# Altium footprint library JL_PCB.PCBLIB: 1112 footprints (part 28 of 71)
Each footprint in its own frame and in the unit in brackets; x right, y up, seen from the top. Pads: shape width x height; smd on the part's side, far side on the other; paste and mask are expansions set on the pad; w line width, h text height; cw(c..) or ccw(c..) is an arc to the next point about the centre after c.
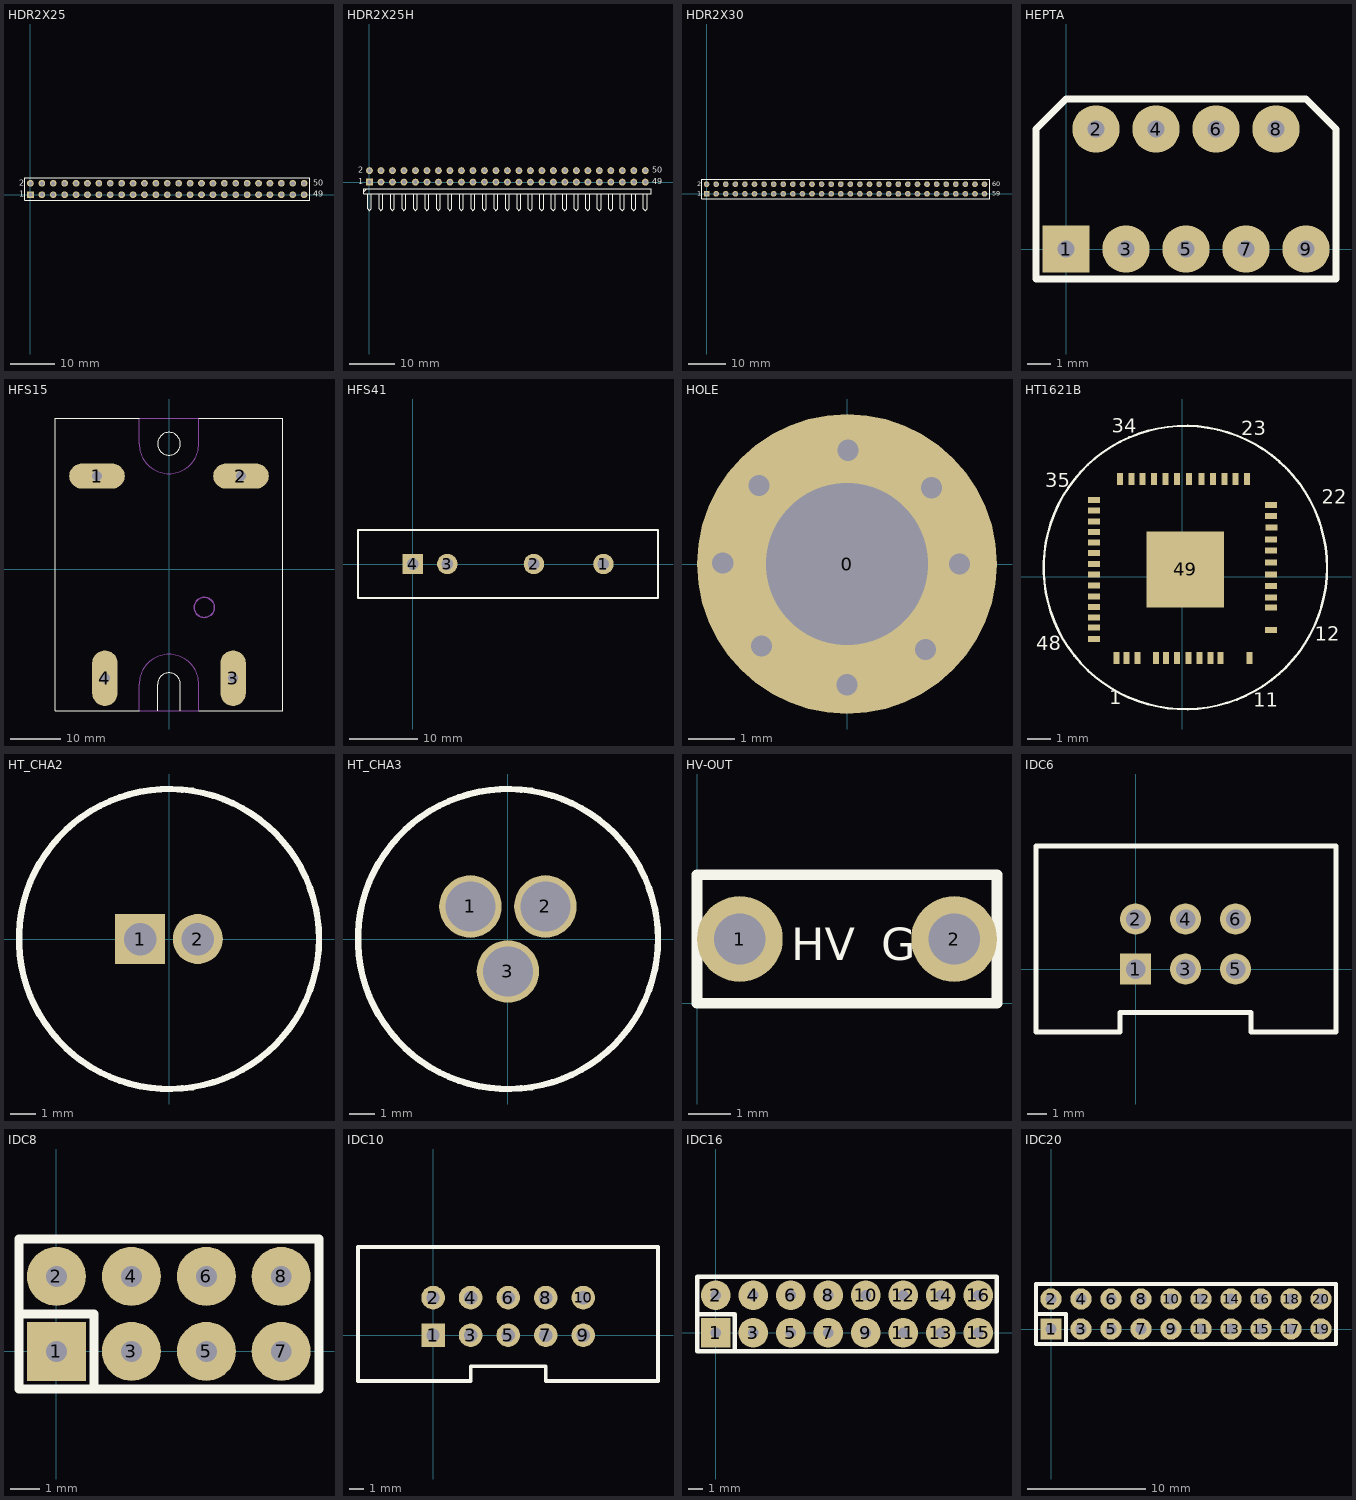
[diagram p27: the footprints below, top view; thin cyan lines are the x and y axes]

## HDR2X25 [mm] "Connector; Header; 25x2 Position"
pads (50):
  rect 1.5x1.5 hole 0.9: 1(0,0)
  round 1.5 hole 0.9: 2(0,2.54) 3(2.54,0) 4(2.54,2.54) 5(5.08,0) 6(5.08,2.54) 7(7.62,0) 8(7.62,2.54) 9(10.16,0) 10(10.16,2.54) 11(12.7,0) 12(12.7,2.54) 13(15.24,0) 14(15.24,2.54) 15(17.78,0) 16(17.78,2.54) 17(20.32,0) 18(20.32,2.54) 19(22.86,0) 20(22.86,2.54) 21(25.4,0) 22(25.4,2.54) 23(27.94,0) 24(27.94,2.54) 25(30.48,0) 26(30.48,2.54) 27(33.02,0) 28(33.02,2.54) 29(35.56,0) 30(35.56,2.54) 31(38.1,0) 32(38.1,2.54) 33(40.64,0) 34(40.64,2.54) 35(43.18,0) 36(43.18,2.54) 37(45.72,0) 38(45.72,2.54) 39(48.26,0) 40(48.26,2.54) 41(50.8,0) 42(50.8,2.54) 43(53.34,0) 44(53.34,2.54) 45(55.88,0) 46(55.88,2.54) 47(58.42,0) 48(58.42,2.54) 49(60.96,0) 50(60.96,2.54)
TopOverlay:
  lines w0.2: -1.27,-1.27 -1.27,3.81 62.23,3.81 62.23,-1.27 -1.27,-1.27
  text "2" at -2.54,2.032 h1.27
  text "1" at -2.54,-0.508 h1.27
  text "49" at 62.992,-0.508 h1.27
  text "50" at 62.992,2.032 h1.27

## HDR2X25H [mm] "Connector; Header; 25x2 Position; Right Angle"
pads (50):
  rect 1.5x1.5 hole 0.9: 1(0,0)
  round 1.5 hole 0.9: 2(0,2.54) 3(2.54,0) 4(2.54,2.54) 5(5.08,0) 6(5.08,2.54) 7(7.62,0) 8(7.62,2.54) 9(10.16,0) 10(10.16,2.54) 11(12.7,0) 12(12.7,2.54) 13(15.24,0) 14(15.24,2.54) 15(17.78,0) 16(17.78,2.54) 17(20.32,0) 18(20.32,2.54) 19(22.86,0) 20(22.86,2.54) 21(25.4,0) 22(25.4,2.54) 23(27.94,0) 24(27.94,2.54) 25(30.48,0) 26(30.48,2.54) 27(33.02,0) 28(33.02,2.54) 29(35.56,0) 30(35.56,2.54) 31(38.1,0) 32(38.1,2.54) 33(40.64,0) 34(40.64,2.54) 35(43.18,0) 36(43.18,2.54) 37(45.72,0) 38(45.72,2.54) 39(48.26,0) 40(48.26,2.54) 41(50.8,0) 42(50.8,2.54) 43(53.34,0) 44(53.34,2.54) 45(55.88,0) 46(55.88,2.54) 47(58.42,0) 48(58.42,2.54) 49(60.96,0) 50(60.96,2.54)
TopOverlay:
  lines w0.2: -1.27,-2.117 -0.635,-1.482 ; -0.423,-2.54 -0.423,-5.927 0,-6.35 0.423,-5.927 0.423,-2.54 ; 2.117,-2.54 2.117,-5.927 2.54,-6.35 2.963,-5.927 2.963,-2.54 ; 4.657,-2.54 4.657,-5.927 5.08,-6.35 5.503,-5.927 5.503,-2.54 ; 7.197,-2.54 7.197,-5.927 7.62,-6.35 8.043,-5.927 8.043,-2.54 ; 9.737,-2.54 9.737,-5.927 10.16,-6.35 10.583,-5.927 10.583,-2.54 ; 12.277,-2.54 12.277,-5.927 12.7,-6.35 13.123,-5.927 13.123,-2.54 ; 14.817,-2.54 14.817,-5.927 15.24,-6.35 15.663,-5.927 15.663,-2.54 ; 17.357,-2.54 17.357,-5.927 17.78,-6.35 18.203,-5.927 18.203,-2.54 ; 19.897,-2.54 19.897,-5.927 20.32,-6.35 20.743,-5.927 20.743,-2.54 ; 22.437,-2.54 22.437,-5.927 22.86,-6.35 23.283,-5.927 23.283,-2.54 ; 24.977,-2.54 24.977,-5.927 25.4,-6.35 25.823,-5.927 25.823,-2.54 ; 27.517,-2.54 27.517,-5.927 27.94,-6.35 28.363,-5.927 28.363,-2.54 ; 30.057,-2.54 30.057,-5.927 30.48,-6.35 30.903,-5.927 30.903,-2.54 ; 32.597,-2.54 32.597,-5.927 33.02,-6.35 33.443,-5.927 33.443,-2.54 ; 35.137,-2.54 35.137,-5.927 35.56,-6.35 35.983,-5.927 35.983,-2.54 ; 37.677,-2.54 37.677,-5.927 38.1,-6.35 38.523,-5.927 38.523,-2.54 ; 40.217,-2.54 40.217,-5.927 40.64,-6.35 41.063,-5.927 41.063,-2.54 ; 42.757,-2.54 42.757,-5.927 43.18,-6.35 43.603,-5.927 43.603,-2.54 ; 45.297,-2.54 45.297,-5.927 45.72,-6.35 46.143,-5.927 46.143,-2.54 ; 47.837,-2.54 47.837,-5.927 48.26,-6.35 48.683,-5.927 48.683,-2.54 ; 50.377,-2.54 50.377,-5.927 50.8,-6.35 51.223,-5.927 51.223,-2.54 ; 52.917,-2.54 52.917,-5.927 53.34,-6.35 53.763,-5.927 53.763,-2.54 ; 55.457,-2.54 55.457,-5.927 55.88,-6.35 56.303,-5.927 56.303,-2.54 ; 57.997,-2.54 57.997,-5.927 58.42,-6.35 58.843,-5.927 58.843,-2.54 ; 60.537,-2.54 60.537,-5.927 60.96,-6.35 61.383,-5.927 61.383,-2.54 ; -1.27,-2.54 -1.27,-1.482 62.23,-1.482 62.23,-2.54 -1.27,-2.54
  text "2" at -2.54,2.032 h1.27
  text "1" at -2.54,-0.508 h1.27
  text "49" at 62.484,-0.508 h1.27
  text "50" at 62.484,2.032 h1.27

## HDR2X30 [mm] "Connector; Header; 30x2 Position"
pads (60):
  rect 1.5x1.5 hole 0.9: 1(0,0)
  round 1.5 hole 0.9: 2(0,2.54) 3(2.54,0) 4(2.54,2.54) 5(5.08,0) 6(5.08,2.54) 7(7.62,0) 8(7.62,2.54) 9(10.16,0) 10(10.16,2.54) 11(12.7,0) 12(12.7,2.54) 13(15.24,0) 14(15.24,2.54) 15(17.78,0) 16(17.78,2.54) 17(20.32,0) 18(20.32,2.54) 19(22.86,0) 20(22.86,2.54) 21(25.4,0) 22(25.4,2.54) 23(27.94,0) 24(27.94,2.54) 25(30.48,0) 26(30.48,2.54) 27(33.02,0) 28(33.02,2.54) 29(35.56,0) 30(35.56,2.54) 31(38.1,0) 32(38.1,2.54) 33(40.64,0) 34(40.64,2.54) 35(43.18,0) 36(43.18,2.54) 37(45.72,0) 38(45.72,2.54) 39(48.26,0) 40(48.26,2.54) 41(50.8,0) 42(50.8,2.54) 43(53.34,0) 44(53.34,2.54) 45(55.88,0) 46(55.88,2.54) 47(58.42,0) 48(58.42,2.54) 49(60.96,0) 50(60.96,2.54) 51(63.5,0) 52(63.5,2.54) 53(66.04,0) 54(66.04,2.54) 55(68.58,0) 56(68.58,2.54) 57(71.12,0) 58(71.12,2.54) 59(73.66,0) 60(73.66,2.54)
TopOverlay:
  lines w0.2: -1.27,-1.27 -1.27,3.81 75.06,3.81 75.06,-1.27 -1.27,-1.27
  text "2" at -2.54,2.032 h1.27
  text "1" at -2.54,-0.508 h1.27
  text "59" at 75.692,-0.508 h1.27
  text "60" at 75.692,2.032 h1.27
BottomOverlay:
  text "1" at -55.88,-0.508 h1.27

## HEPTA [mm]
pads (9):
  rect 2x2 hole 0.711: 1(0,0)
  round 2 hole 0.711: 2(1.27,5.08) 3(2.54,0) 4(3.81,5.08) 5(5.08,0) 6(6.35,5.08) 7(7.62,0) 8(8.89,5.08) 9(10.16,0)
TopOverlay:
  lines w0.305: -1.27,-1.27 11.43,-1.27 11.43,5.08 10.16,6.35 0,6.35 -1.27,5.08 -1.27,-1.27

## HFS15 [mm]
pads (4):
  oval 11x5 hole 2: 1(-14.254,18.4) 2(14.254,18.4)
  oval 5x11 hole 2: 3(12.7,-21.6) 4(-12.7,-21.6)
TopOverlay:
  circle w0.2: c0,24.8 r2.25
  lines w0.2: -5.9,-28.1 -22.5,-28.1 -22.5,29.9 -5.9,29.9 ; -2.25,-28.1 -2.25,-22.8 cw(c0,-22.8) 2.25,-22.8 2.25,-28.1 ; 5.9,-28.1 22.5,-28.1 22.5,29.9 5.9,29.9
Mechanical1:
  circle w0.254: c7,-7.6 r2
  lines w0.2: -13.709,-18.58 cw(c-12.709,-18.58) -11.709,-18.58 ; -13.703,-18.58 -13.703,-24.638 ccw(c-12.703,-24.638) -11.703,-24.638 -11.703,-18.58 ; -11.214,17.406 -17.272,17.406 cw(c-17.272,18.406) -17.272,19.406 -11.214,19.406 ; -11.214,17.412 ccw(c-11.214,18.412) -11.214,19.412 ; 11.691,-18.58 cw(c12.691,-18.58) 13.691,-18.58 ; 11.697,-18.58 11.697,-24.638 ccw(c12.697,-24.638) 13.697,-24.638 13.697,-18.58 ; 17.259,17.393 11.201,17.393 cw(c11.201,18.393) 11.201,19.393 17.259,19.393 ; 17.259,17.399 ccw(c17.259,18.399) 17.259,19.399 ; -5.9,-28.1 -5.9,-22.8 cw(c0,-22.8) 5.9,-22.8 5.9,-28.1 -5.9,-28.1 ; -5.9,24.8 ccw(c0,24.8) 5.9,24.8 5.9,29.9 -5.9,29.9 -5.9,24.8

## HFS41 [mm]
pads (4):
  round 3 hole 1.7: 1(28,0) 2(17.8,0) 3(5.1,0)
  rect 3x3 hole 1.7: 4(0,0)
TopOverlay:
  lines w0.254: -8,-5 36,-5 36,5 -8,5 -8,-5
3D body: height 0, standoff 0, extent -8.127,-5.127 36.127,5.127
3D body: height 0, standoff 0, extent -8,-4.999 35.999,4.999
3D body: height 0, standoff 0, extent -8.127,-5.127 36.127,5.127
3D body: height 25, standoff 2, extent -1.602,-1.602 29.602,1.602
3D body: height 0, standoff 0, extent -8,-4.999 35.999,4.999
3D body: height 0, standoff 0, extent -8.127,-5.127 36.127,5.127
3D body: height 0, standoff 0, extent -8.127,-5.127 36.127,5.127
3D body: height 25, standoff 0, extent -1.602,-1.602 29.602,1.602

## HOLE [mm]
pads (1):
  round 6.5 hole 3.5: 0(0,0)
via -1.905,1.702 diameter 0.889 hole 0.457
via -1.854,-1.778 diameter 0.889 hole 0.457
via 1.702,-1.854 diameter 0.889 hole 0.457
via 0,-2.616 diameter 0.889 hole 0.457
via -2.692,0.025 diameter 0.889 hole 0.457
via 2.438,0 diameter 0.889 hole 0.457
via 1.829,1.651 diameter 0.889 hole 0.457
via 0.025,2.464 diameter 0.889 hole 0.457

## HT1621B [mil]
pads (49):
  rect 10x20 smd: 1(-110,-136) 2(-93,-136) 3(-75,-136) 4(-44,-136) 5(-27,-136) 6(-9,-136) 7(10,-136) 8(29,-136) 9(47,-136) 10(64,-136) 11(112,-136) 23(108,163) 24(89,163) 25(70,163) 26(51,163) 27(32,163) 28(11,163) 29(-9,163) 30(-28,163) 31(-47,163) 32(-66,163) 33(-85,163) 34(-104,163)
  rect 20x10 smd: 12(148,-89) 13(148,-52) 14(148,-35) 15(148,-16) 16(148,3) 17(148,23) 18(148,43) 19(148,62) 20(149,82) 21(148,101) 22(148,119) 35(-147,128) 36(-147,110) 37(-147,92) 38(-147,74) 39(-147,57) 40(-147,39) 41(-147,21) 42(-147,3) 43(-147,-15) 44(-147,-33) 45(-147,-51) 46(-147,-68) 47(-147,-85) 48(-147,-104)
  rect 129x127 smd: 49(5,12)
TopOverlay:
  circle w3.94: c5,15 r236.22
  text "1" at -121.93,-213.35 h23.62
  text "11" at 118.23,-217.28 h23.62
  text "12" at 220.59,-107.05 h23.62
  text "23" at 98.54,235.47 h23.62
  text "48" at -243.98,-122.8 h23.62
  text "22" at 232.59,121.47 h23.62
  text "34" at -117.99,239.41 h23.62
  text "35" at -228.23,148.86 h23.62

## HT_CHA2 [mm]
pads (2):
  rect 2x2 hole 1.3: 1(-1.15,0)
  round 2 hole 1.3: 2(1.15,0)
TopOverlay:
  circle w0.254: c0,0 r6

## HT_CHA3 [mm]
pads (3):
  round 2.5 hole 2: 1(-1.5,1.3) 2(1.5,1.3) 3(0,-1.298)
TopOverlay:
  circle w0.254: c0,0 r6

## HV-OUT [mm]
pads (2):
  round 2 hole 1.2: 1(1,1.5) 2(6,1.5)
TopOverlay:
  lines w0.254: 0,0 0,3 7,3 7,0 0,0
  text "HV" at 2.2,1 h0.76
  text "G" at 4.3,1 h0.76

## IDC6 [mil]
pads (6):
  rect 62x62 hole 39: 1(0,0)
  round 62 hole 39: 2(0,100) 3(100,0) 4(100,100) 5(200,0) 6(200,100)
TopOverlay:
  lines w10: -199,-126 -199,246 401,246 401,-126 231.5,-125.98 231.5,-86.61 -31.5,-86.61 -31.5,-125.98 -198.98,-125.98
3D body "IDC6.STEP": height 358.27, standoff -122.05, extent -199,-126.05 401,246

## IDC8 [mm]
pads (8):
  rect 2x2 hole 0.711: 1(0,0)
  round 2 hole 0.711: 2(0,2.54) 3(2.54,0) 4(2.54,2.54) 5(5.08,0) 6(5.08,2.54) 7(7.62,0) 8(7.62,2.54)
TopOverlay:
  lines w0.305: -1.27,1.27 1.27,1.27 1.27,-1.27 ; 8.89,-1.27 -1.27,-1.27 -1.27,3.81 8.9,3.8 8.9,-1.28
3D body "User Library-8 pin IDC shrouded header V2.step": height 9.02, standoff -3.13, extent -5.055,-3.429 12.725,5.771

## IDC10 [mm]
pads (10):
  rect 1.6x1.6 hole 0.9: 1(0,0)
  round 1.6 hole 0.9: 2(0,2.54) 3(2.54,0) 4(2.54,2.54) 5(5.08,0) 6(5.08,2.54) 7(7.62,0) 8(7.62,2.54) 9(10.16,0) 10(10.16,2.54)
TopOverlay:
  lines w0.254: -5.08,5.385 -5.08,5.969 15.215,5.969 15.215,-3.099 15.213,-3.1 7.62,-3.1 7.62,-2.1 2.54,-2.1 2.54,-3.1 -5.079,-3.1 -5.08,-3.099 -5.08,5.563
3D body "User Library-IDC-10M.STEP": height 9.3, standoff -3.1, extent -5.07,-3.131 15.23,5.969

## IDC16 [mm]
pads (16):
  rect 2x2 hole 0.711: 1(0,0)
  round 2 hole 0.711: 2(0,2.54) 3(2.54,0) 4(2.54,2.54) 5(5.08,0) 6(5.08,2.54) 7(7.62,0) 8(7.62,2.54) 9(10.16,0) 10(10.16,2.54) 11(12.7,0) 12(12.7,2.54) 13(15.24,0) 14(15.24,2.54) 15(17.78,0) 16(17.78,2.54)
TopOverlay:
  lines w0.305: -1.27,1.27 1.27,1.27 1.27,-1.27 ; -1.27,-1.27 19.05,-1.27 19.05,3.81 -1.27,3.81 -1.27,-1.27

## IDC20 [mm]
pads (20):
  rect 1.8x1.8 hole 0.9: 1(0,0)
  round 1.8 hole 0.9: 2(0,2.54) 3(2.54,0) 4(2.54,2.54) 5(5.08,0) 6(5.08,2.54) 7(7.62,0) 8(7.62,2.54) 9(10.16,0) 10(10.16,2.54) 11(12.7,0) 12(12.7,2.54) 13(15.24,0) 14(15.24,2.54) 15(17.78,0) 16(17.78,2.54) 17(20.32,0) 18(20.32,2.54) 19(22.86,0) 20(22.86,2.54)
TopOverlay:
  lines w0.305: -1.27,1.27 1.27,1.27 1.27,-1.27 ; -1.27,-1.27 24.13,-1.27 24.13,3.81 -1.27,3.81 -1.27,-1.27